# Altium footprint library CHIP.PcbLib: 86 footprints (part 6 of 6)
Each footprint in its own frame and in the unit in brackets; x right, y up, seen from the top. Pads: shape width x height; smd on the part's side, far side on the other; paste and mask are expansions set on the pad; w line width, h text height; cw(c..) or ccw(c..) is an arc to the next point about the centre after c.
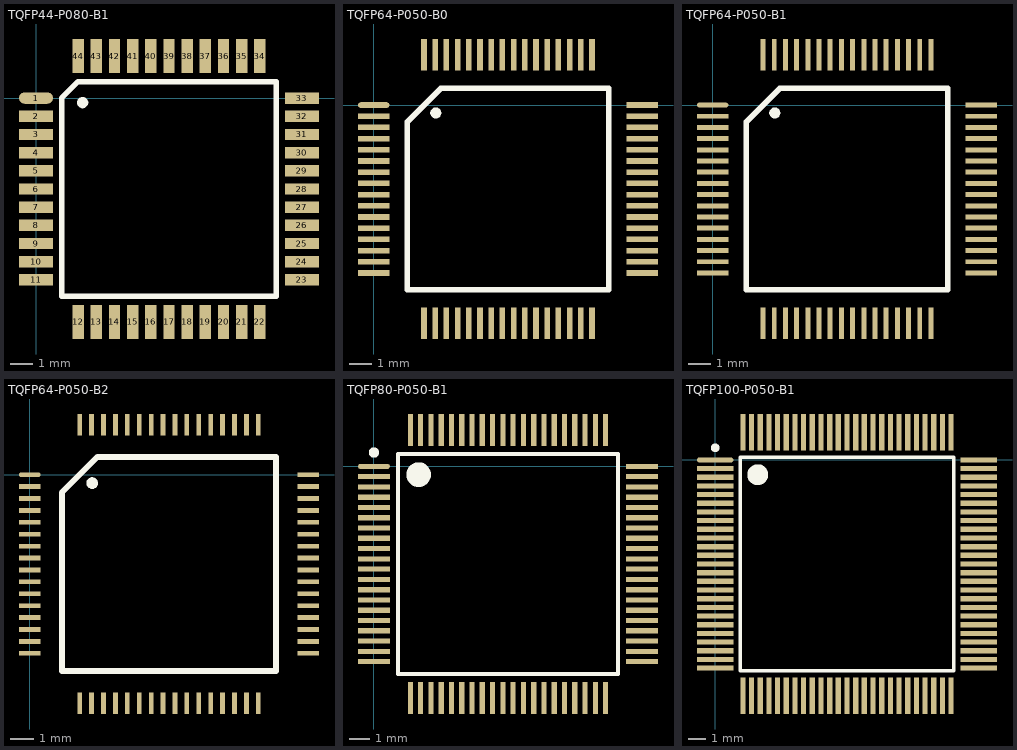
[diagram p5: the footprints below, top view; thin cyan lines are the x and y axes]

## TQFP44-P080-B1 [mm]
pads (45):
  oval 1.5x0.5 smd: 1(0,0)
  rect 1.5x0.5 smd: 2(0,-0.8) 3(0,-1.6) 4(0,-2.4) 5(0,-3.2) 6(0,-4) 7(0,-4.8) 8(0,-5.6) 9(0,-6.4) 10(0,-7.2) 11(0,-8) 23(11.7,-8) 24(11.7,-7.2) 25(11.7,-6.4) 26(11.7,-5.6) 27(11.7,-4.8) 28(11.7,-4) 29(11.7,-3.2) 30(11.7,-2.4) 31(11.7,-1.6) 32(11.7,-0.8) 33(11.7,0)
  rect 0.5x1.5 smd: 12(1.85,-9.85) 13(2.65,-9.85) 14(3.45,-9.85) 15(4.25,-9.85) 16(5.05,-9.85) 17(5.85,-9.85) 18(6.65,-9.85) 19(7.45,-9.85) 20(8.25,-9.85) 21(9.05,-9.85) 22(9.85,-9.85) 34(9.85,1.85) 35(9.05,1.85) 36(8.25,1.85) 37(7.45,1.85) 38(6.65,1.85) 39(5.85,1.85) 40(5.05,1.85) 41(4.25,1.85) 42(3.45,1.85) 43(2.65,1.85) 44(1.85,1.85)
  round 0.5 on Top Overlay: ""(2.05,-0.2)
Top Overlay:
  lines w0.25: 1.125,-8.725 1.125,0 1.85,0.725 10.575,0.725 10.575,-8.725 1.125,-8.725
3D body "User Library-TQFP44.STEP": height 1.13, standoff 0.06, extent -0.166,-9.986 11.834,2.014

## TQFP64-P050-B0 [mm]
height 1.2
pads (65):
  oval 1.4x0.25 smd: 1(0,0)
  rect 1.4x0.25 smd: 2(0,-0.5) 3(0,-1) 4(0,-1.5) 5(0,-2) 6(0,-2.5) 7(0,-3) 8(0,-3.5) 9(0,-4) 10(0,-4.5) 11(0,-5) 12(0,-5.5) 13(0,-6) 14(0,-6.5) 15(0,-7) 16(0,-7.5) 33(12,-7.5) 34(12,-7) 35(12,-6.5) 36(12,-6) 37(12,-5.5) 38(12,-5) 39(12,-4.5) 40(12,-4) 41(12,-3.5) 42(12,-3) 43(12,-2.5) 44(12,-2) 45(12,-1.5) 46(12,-1) 47(12,-0.5) 48(12,0)
  rect 0.25x1.4 smd: 17(2.25,-9.75) 18(2.75,-9.75) 19(3.25,-9.75) 20(3.75,-9.75) 21(4.25,-9.75) 22(4.75,-9.75) 23(5.25,-9.75) 24(5.75,-9.75) 25(6.25,-9.75) 26(6.75,-9.75) 27(7.25,-9.75) 28(7.75,-9.75) 29(8.25,-9.75) 30(8.75,-9.75) 31(9.25,-9.75) 32(9.75,-9.75) 49(9.75,2.25) 50(9.25,2.25) 51(8.75,2.25) 52(8.25,2.25) 53(7.75,2.25) 54(7.25,2.25) 55(6.75,2.25) 56(6.25,2.25) 57(5.75,2.25) 58(5.25,2.25) 59(4.75,2.25) 60(4.25,2.25) 61(3.75,2.25) 62(3.25,2.25) 63(2.75,2.25) 64(2.25,2.25)
  round 0.5 on Top Overlay: ""(2.775,-0.35)
Top Overlay:
  lines w0.25: 1.5,-8.25 10.5,-8.25 10.5,0.75 3,0.75 1.5,-0.75 1.5,-8.25
3D body "User Library-PIC32MX3_4FXXXH.STEP": height 1.2, standoff 0, extent -0.006,-9.762 12.006,2.25

## TQFP64-P050-B1 [mm]
height 1.2
pads (65):
  oval 1.4x0.22 smd: 1(0,0)
  rect 1.4x0.22 smd: 2(0,-0.5) 3(0,-1) 4(0,-1.5) 5(0,-2) 6(0,-2.5) 7(0,-3) 8(0,-3.5) 9(0,-4) 10(0,-4.5) 11(0,-5) 12(0,-5.5) 13(0,-6) 14(0,-6.5) 15(0,-7) 16(0,-7.5) 33(12,-7.5) 34(12,-7) 35(12,-6.5) 36(12,-6) 37(12,-5.5) 38(12,-5) 39(12,-4.5) 40(12,-4) 41(12,-3.5) 42(12,-3) 43(12,-2.5) 44(12,-2) 45(12,-1.5) 46(12,-1) 47(12,-0.5) 48(12,0)
  rect 0.22x1.4 smd: 17(2.25,-9.75) 18(2.75,-9.75) 19(3.25,-9.75) 20(3.75,-9.75) 21(4.25,-9.75) 22(4.75,-9.75) 23(5.25,-9.75) 24(5.75,-9.75) 25(6.25,-9.75) 26(6.75,-9.75) 27(7.25,-9.75) 28(7.75,-9.75) 29(8.25,-9.75) 30(8.75,-9.75) 31(9.25,-9.75) 32(9.75,-9.75) 49(9.75,2.25) 50(9.25,2.25) 51(8.75,2.25) 52(8.25,2.25) 53(7.75,2.25) 54(7.25,2.25) 55(6.75,2.25) 56(6.25,2.25) 57(5.75,2.25) 58(5.25,2.25) 59(4.75,2.25) 60(4.25,2.25) 61(3.75,2.25) 62(3.25,2.25) 63(2.75,2.25) 64(2.25,2.25)
  round 0.5 on Top Overlay: ""(2.775,-0.35)
Top Overlay:
  lines w0.25: 1.5,-8.25 10.5,-8.25 10.5,0.75 3,0.75 1.5,-0.75 1.5,-8.25
3D body "User Library-PIC32MX3_4FXXXH.STEP": height 1.2, standoff 0, extent -0.006,-9.762 12.006,2.25

## TQFP64-P050-B2 [mm]
height 1.2
pads (65):
  oval 0.9x0.2 smd: 1(0,0)
  rect 0.9x0.2 smd: 2(0,-0.5) 3(0,-1) 4(0,-1.5) 5(0,-2) 6(0,-2.5) 7(0,-3) 8(0,-3.5) 9(0,-4) 10(0,-4.5) 11(0,-5) 12(0,-5.5) 13(0,-6) 14(0,-6.5) 15(0,-7) 16(0,-7.5) 33(11.7,-7.5) 34(11.7,-7) 35(11.7,-6.5) 36(11.7,-6) 37(11.7,-5.5) 38(11.7,-5) 39(11.7,-4.5) 40(11.7,-4) 41(11.7,-3.5) 42(11.7,-3) 43(11.7,-2.5) 44(11.7,-2) 45(11.7,-1.5) 46(11.7,-1) 47(11.7,-0.5) 48(11.7,0)
  rect 0.2x0.9 smd: 17(2.1,-9.6) 18(2.6,-9.6) 19(3.1,-9.6) 20(3.6,-9.6) 21(4.1,-9.6) 22(4.6,-9.6) 23(5.1,-9.6) 24(5.6,-9.6) 25(6.1,-9.6) 26(6.6,-9.6) 27(7.1,-9.6) 28(7.6,-9.6) 29(8.1,-9.6) 30(8.6,-9.6) 31(9.1,-9.6) 32(9.6,-9.6) 49(9.6,2.1) 50(9.1,2.1) 51(8.6,2.1) 52(8.1,2.1) 53(7.6,2.1) 54(7.1,2.1) 55(6.6,2.1) 56(6.1,2.1) 57(5.6,2.1) 58(5.1,2.1) 59(4.6,2.1) 60(4.1,2.1) 61(3.6,2.1) 62(3.1,2.1) 63(2.6,2.1) 64(2.1,2.1)
  round 0.5 on Top Overlay: ""(2.625,-0.35)
Top Overlay:
  lines w0.25: 1.35,-8.25 1.35,-0.75 2.85,0.75 10.35,0.75 10.35,-8.25 1.35,-8.25
3D body "User Library-PIC32MX3_4FXXXH.STEP": height 1.2, standoff 0, extent -0.156,-9.762 11.856,2.25

## TQFP80-P050-B1 [mm]
pads (80):
  oval 1.55x0.25 smd: 1(0,0)
  rect 1.55x0.25 smd: 2(0,-0.5) 3(0,-1) 4(0,-1.5) 5(0,-2) 6(0,-2.5) 7(0,-3) 8(0,-3.5) 9(0,-4) 10(0,-4.5) 11(0,-5) 12(0,-5.5) 13(0,-6) 14(0,-6.5) 15(0,-7) 16(0,-7.5) 17(0,-8) 18(0,-8.5) 19(0,-9) 20(0,-9.5) 41(13.05,-9.5) 42(13.05,-9) 43(13.05,-8.5) 44(13.05,-8) 45(13.05,-7.5) 46(13.05,-7) 47(13.05,-6.5) 48(13.05,-6) 49(13.05,-5.5) 50(13.05,-5) 51(13.05,-4.5) 52(13.05,-4) 53(13.05,-3.5) 54(13.05,-3) 55(13.05,-2.5) 56(13.05,-2) 57(13.05,-1.5) 58(13.05,-1) 59(13.05,-0.5) 60(13.05,0)
  rect 0.25x1.55 smd: 21(1.775,-11.275) 22(2.275,-11.275) 23(2.775,-11.275) 24(3.275,-11.275) 25(3.775,-11.275) 26(4.275,-11.275) 27(4.775,-11.275) 28(5.275,-11.275) 29(5.775,-11.275) 30(6.275,-11.275) 31(6.775,-11.275) 32(7.275,-11.275) 33(7.775,-11.275) 34(8.275,-11.275) 35(8.775,-11.275) 36(9.275,-11.275) 37(9.775,-11.275) 38(10.275,-11.275) 39(10.775,-11.275) 40(11.275,-11.275) 61(11.275,1.775) 62(10.775,1.775) 63(10.275,1.775) 64(9.775,1.775) 65(9.275,1.775) 66(8.775,1.775) 67(8.275,1.775) 68(7.775,1.775) 69(7.275,1.775) 70(6.775,1.775) 71(6.275,1.775) 72(5.775,1.775) 73(5.275,1.775) 74(4.775,1.775) 75(4.275,1.775) 76(3.775,1.775) 77(3.275,1.775) 78(2.775,1.775) 79(2.275,1.775) 80(1.775,1.775)
Top Overlay:
  circle w0.25: c0,0.675 r0.125
  circle w0.6: c2.175,-0.4 r0.3
  lines w0.2: 1.175,-10.1 1.175,0.6 11.875,0.6 11.875,-10.1 1.175,-10.1
3D body "User Library-TQFP-80.STEP": height 1.05, standoff -0.01, extent -0.475,-11.749 13.525,2.251

## TQFP100-P050-B1 [mm]
height 1.6
pads (100):
  oval 2.1x0.3 smd: 1(0,0)
  rect 2.1x0.3 smd: 2(0,-0.5) 3(0,-1) 4(0,-1.5) 5(0,-2) 6(0,-2.5) 7(0,-3) 8(0,-3.5) 9(0,-4) 10(0,-4.5) 11(0,-5) 12(0,-5.5) 13(0,-6) 14(0,-6.5) 15(0,-7) 16(0,-7.5) 17(0,-8) 18(0,-8.5) 19(0,-9) 20(0,-9.5) 21(0,-10) 22(0,-10.5) 23(0,-11) 24(0,-11.5) 25(0,-12) 51(15.2,-12) 52(15.2,-11.5) 53(15.2,-11) 54(15.2,-10.5) 55(15.2,-10) 56(15.2,-9.5) 57(15.2,-9) 58(15.2,-8.5) 59(15.2,-8) 60(15.2,-7.5) 61(15.2,-7) 62(15.2,-6.5) 63(15.2,-6) 64(15.2,-5.5) 65(15.2,-5) 66(15.2,-4.5) 67(15.2,-4) 68(15.2,-3.5) 69(15.2,-3) 70(15.2,-2.5) 71(15.2,-2) 72(15.2,-1.5) 73(15.2,-1) 74(15.2,-0.5) 75(15.2,0)
  rect 0.3x2.1 smd: 26(1.6,-13.6) 27(2.1,-13.6) 28(2.6,-13.6) 29(3.1,-13.6) 30(3.6,-13.6) 31(4.1,-13.6) 32(4.6,-13.6) 33(5.1,-13.6) 34(5.6,-13.6) 35(6.1,-13.6) 36(6.6,-13.6) 37(7.1,-13.6) 38(7.6,-13.6) 39(8.1,-13.6) 40(8.6,-13.6) 41(9.1,-13.6) 42(9.6,-13.6) 43(10.1,-13.6) 44(10.6,-13.6) 45(11.1,-13.6) 46(11.6,-13.6) 47(12.1,-13.6) 48(12.6,-13.6) 49(13.1,-13.6) 50(13.6,-13.6) 76(13.6,1.6) 77(13.1,1.6) 78(12.6,1.6) 79(12.1,1.6) 80(11.6,1.6) 81(11.1,1.6) 82(10.6,1.6) 83(10.1,1.6) 84(9.6,1.6) 85(9.1,1.6) 86(8.6,1.6) 87(8.1,1.6) 88(7.6,1.6) 89(7.1,1.6) 90(6.6,1.6) 91(6.1,1.6) 92(5.6,1.6) 93(5.1,1.6) 94(4.6,1.6) 95(4.1,1.6) 96(3.6,1.6) 97(3.1,1.6) 98(2.6,1.6) 99(2.1,1.6) 100(1.6,1.6)
Top Overlay:
  circle w0.25: c0,0.7 r0.125
  circle w0.6: c2.45,-0.85 r0.3
  lines w0.2: 1.45,-12.15 1.45,0.15 13.75,0.15 13.75,-12.15 1.45,-12.15
3D body "SW3dPS-TQFP100-1.STEP": height 1.61, standoff -0.01, extent -0.401,-14.008 15.599,1.992